# Altium footprint library Reflow3D1411sep.PcbLib: 657 footprints (part 22 of 42)
Each footprint in its own frame and in the unit in brackets; x right, y up, seen from the top. Pads: shape width x height; smd on the part's side, far side on the other; paste and mask are expansions set on the pad; w line width, h text height; cw(c..) or ccw(c..) is an arc to the next point about the centre after c.
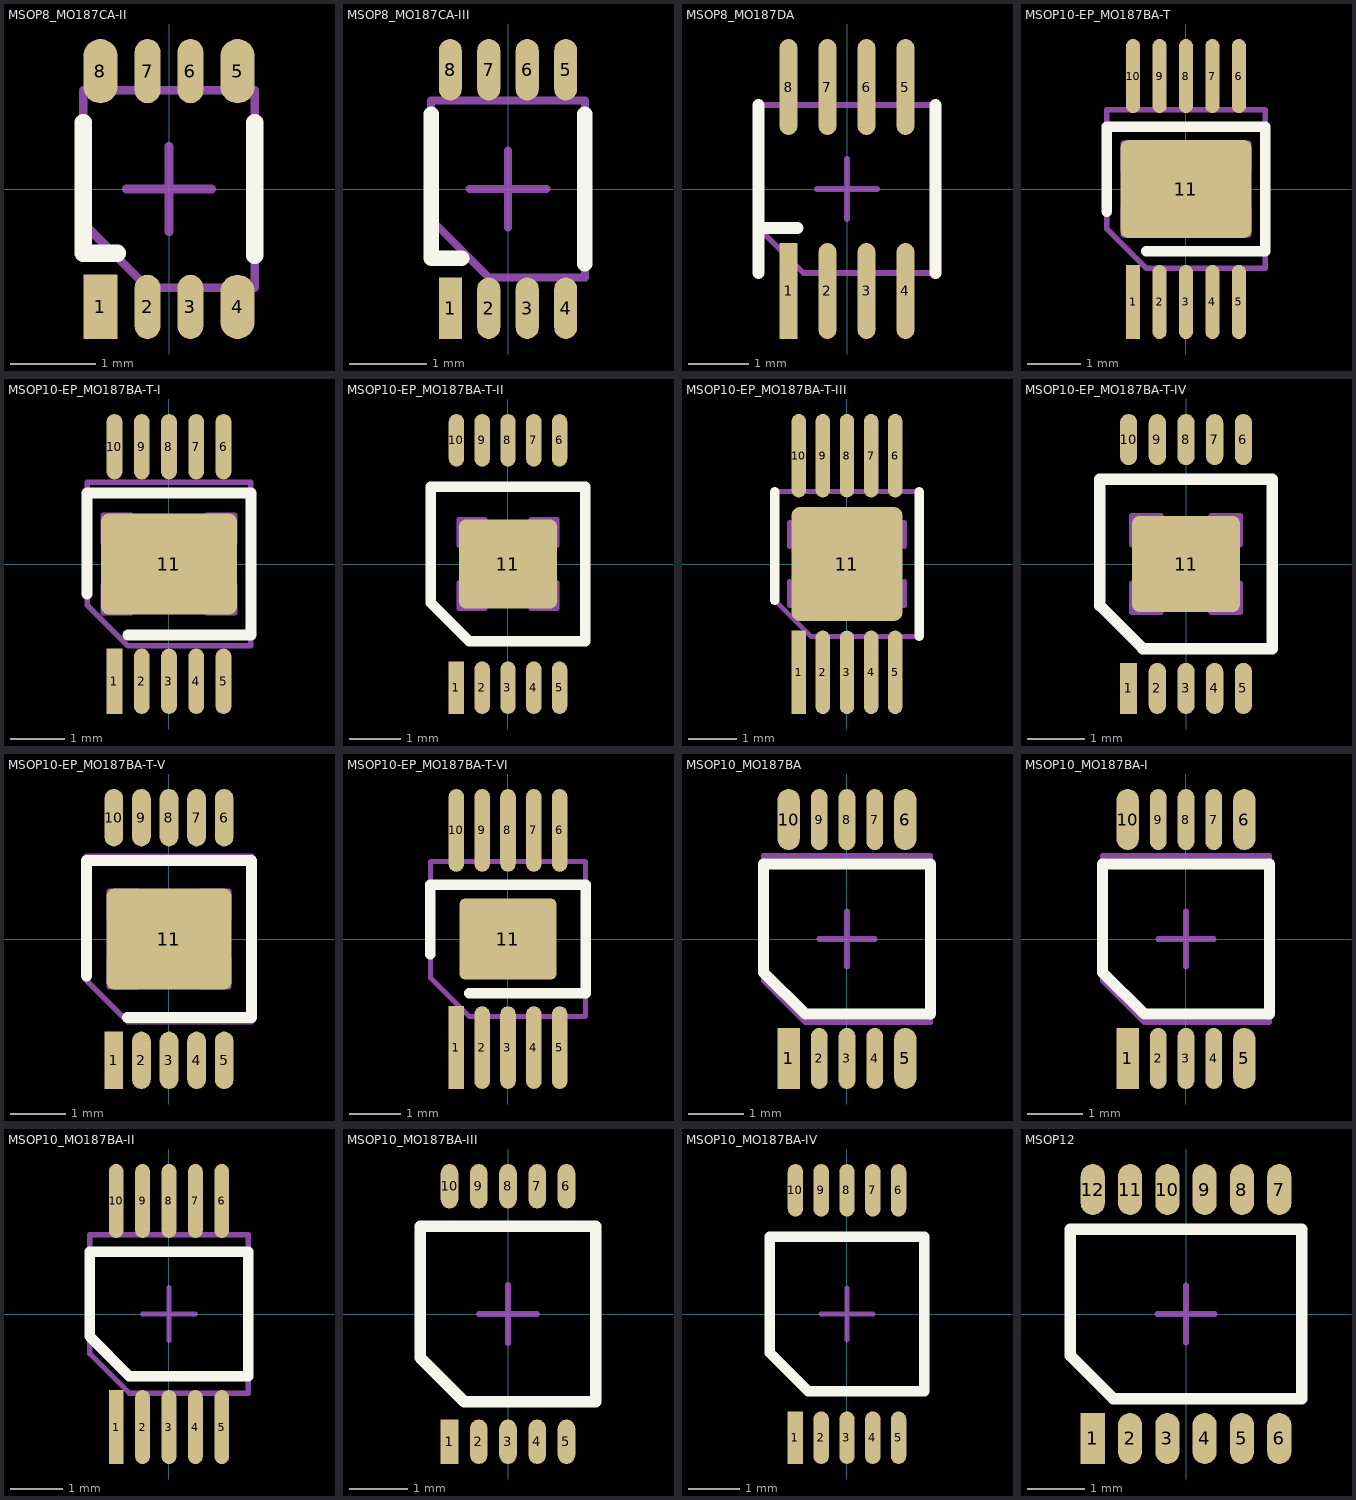
[diagram p21: the footprints below, top view; thin cyan lines are the x and y axes]

## MSOP8_MO187CA-II [mm] "www.nxp.com, sot765-1_po.pdf, sot765-1_fr.pdf; www.jedec.org, mo-187e.pdf"
height 0.8
pads (8):
  rect 0.4x0.75 smd mask+0.05: 1(-0.8,-1.375)
  oval 0.3x0.75 smd mask+0.05: 2(-0.25,-1.375) 3(0.25,-1.375) 6(0.25,1.375) 7(-0.25,1.375)
  oval 0.4x0.75 smd mask+0.05: 4(0.8,-1.375) 5(0.8,1.375) 8(-0.8,1.375)
Top Overlay:
  lines w0.2: -1,0.775 -1,-0.75 -0.6,-0.75 ; 1,-0.775 1,0.775
Mechanical 13:
  lines w0.1: -1,-0.4 -1,1.15 1,1.15 1,-1.15 -0.25,-1.15 -1,-0.4
Mechanical 15:
  lines w0.1: -0.5,0 0.5,0 ; 0,-0.5 0,0.5
3D body: height 1, standoff 0, extent -1.05,-1.2 1.05,1.2

## MSOP8_MO187CA-III [mm] "www.ti.com, sces477c.pdf"
height 0.75
pads (8):
  rect 0.3x0.8 smd mask+0.05: 1(-0.75,-1.55)
  oval 0.3x0.8 smd mask+0.05: 2(-0.25,-1.55) 3(0.25,-1.55) 4(0.75,-1.55) 5(0.75,1.55) 6(0.25,1.55) 7(-0.25,1.55) 8(-0.75,1.55)
Top Overlay:
  lines w0.2: -1,0.975 -1,-0.9 -0.6,-0.9 ; 1,-0.975 1,0.975
Mechanical 13:
  lines w0.1: -1,-0.4 -1,1.15 1,1.15 1,-1.15 -0.25,-1.15 -1,-0.4
Mechanical 15:
  lines w0.1: -0.5,0 0.5,0 ; 0,-0.5 0,0.5
3D body: height 0.9, standoff 0, extent -1.05,-1.2 1.05,1.2

## MSOP8_MO187DA [mm] "www.ti.com, mpds049b.pdf, DCT8.asc"
height 1.18
pads (8):
  rect 0.3x1.6 smd mask+0.075: 1(-0.975,-1.7)
  oval 0.3x1.6 smd mask+0.075: 2(-0.325,-1.7) 3(0.325,-1.7) 4(0.975,-1.7) 5(0.975,1.7) 6(0.325,1.7) 7(-0.325,1.7) 8(-0.975,1.7)
Top Overlay:
  lines w0.2: -1.475,-1.4 -1.475,1.4 ; -1.475,-0.65 -0.825,-0.65 ; 1.475,-1.4 1.475,1.4
Mechanical 13:
  lines w0.1: -1.475,-0.65 -0.725,-1.4 1.475,-1.4 1.475,1.4 -1.475,1.4 -1.475,-0.65
Mechanical 15:
  lines w0.1: -0.5,0 0.5,0 ; 0,-0.5 0,0.5
3D body: height 1.3, standoff 0, extent -1.575,-1.45 1.575,1.45

## MSOP10-EP_MO187BA-T [mm] "www.maxim-ic.com, 21-0109.PDF, 90-0148.PDF"
height 0.93
pads (11):
  rect 0.27x1.4 smd mask+0.05: 1(-1,-2.135)
  oval 0.27x1.4 smd mask+0.05: 2(-0.5,-2.135) 3(0,-2.135) 4(0.5,-2.135) 5(1,-2.135) 6(1,2.135) 7(0.5,2.135) 8(0,2.135) 9(-0.5,2.135) 10(-1,2.135)
  rrect15% 2.47x1.85 smd mask+0.075: 11(0,0)
Top Overlay:
  lines w0.2: -1.5,-0.425 -1.5,1.175 1.5,1.175 1.5,-1.175 -0.75,-1.175
Mechanical 13:
  lines w0.1: -1.185,-0.365 -1.185,-0.865 -0.685,-0.865 ; -1.185,0.365 -1.185,0.865 -0.685,0.865 ; 0.685,-0.865 1.185,-0.865 1.185,-0.365 ; 0.685,0.865 1.185,0.865 1.185,0.365 ; -1.5,-0.75 -0.75,-1.5 1.5,-1.5 1.5,1.5 -1.5,1.5 -1.5,-0.75
Mechanical 15:
  lines w0.1: -0.5,0 0.5,0 ; 0,-0.5 0,0.5
3D body: height 1.1, standoff 0, extent -1.525,-1.525 1.525,1.525

## MSOP10-EP_MO187BA-T-I [mm] "www.hittite.com, ms10_ms10g_package_info.pdf; www.jedec.org, mo-187e.pdf"
height 0.93
pads (11):
  rect 0.29x1.2 smd mask+0.05: 1(-1,-2.15)
  oval 0.29x1.2 smd mask+0.05: 2(-0.5,-2.15) 3(0,-2.15) 4(0.5,-2.15) 5(1,-2.15) 6(1,2.15) 7(0.5,2.15) 8(0,2.15) 9(-0.5,2.15) 10(-1,2.15)
  rrect15% 2.49x1.85 smd mask+0.075: 11(0,0)
Top Overlay:
  lines w0.2: -1.5,-0.55 -1.5,1.3 1.5,1.3 1.5,-1.3 -0.75,-1.3
Mechanical 13:
  lines w0.1: -1.205,-0.39 -1.205,-0.89 -0.705,-0.89 ; -1.205,0.39 -1.205,0.89 -0.705,0.89 ; 0.705,-0.89 1.205,-0.89 1.205,-0.39 ; 0.705,0.89 1.205,0.89 1.205,0.39 ; -1.5,-0.75 -1.5,1.5 1.5,1.5 1.5,-1.5 -0.75,-1.5 -1.5,-0.75
Mechanical 15:
  lines w0.1: -0.5,0 0.5,0 ; 0,-0.5 0,0.5
3D body: height 1.1, standoff 0, extent -1.55,-1.55 1.55,1.55

## MSOP10-EP_MO187BA-T-II [mm] "www.national.com, muc10a.pdf"
height 0.97
pads (11):
  rect 0.3x1.02 smd mask+0.05: 1(-1,-2.4)
  oval 0.3x1.02 smd mask+0.05: 2(-0.5,-2.4) 3(0,-2.4) 4(0.5,-2.4) 5(1,-2.4) 6(1,2.4) 7(0.5,2.4) 8(0,2.4) 9(-0.5,2.4) 10(-1,2.4)
  rrect15% 1.9x1.73 smd mask+0.075: 11(0,0)
Top Overlay:
  lines w0.2: -1.5,-0.75 -0.75,-1.5 1.5,-1.5 1.5,1.5 -1.5,1.5 -1.5,-0.75
Mechanical 13:
  lines w0.1: -0.95,-0.365 -0.95,-0.865 -0.45,-0.865 ; -0.95,0.365 -0.95,0.865 -0.45,0.865 ; 0.45,-0.865 0.95,-0.865 0.95,-0.365 ; 0.45,0.865 0.95,0.865 0.95,0.365 ; -1.5,-0.75 -0.75,-1.5 1.5,-1.5 1.5,1.5 -1.5,1.5 -1.5,-0.75
Mechanical 15:
  lines w0.1: -0.5,0 0.5,0 ; 0,-0.5 0,0.5
3D body: height 1.09, standoff 0, extent -1.55,-1.55 1.55,1.55

## MSOP10-EP_MO187BA-T-III [mm] "www.national.com, mxf10a.pdf"
height 0.95
pads (11):
  rect 0.3x1.73 smd mask+0.05: 1(-1,-2.245)
  oval 0.3x1.73 smd mask+0.05: 2(-0.5,-2.245) 3(0,-2.245) 4(0.5,-2.245) 5(1,-2.245) 6(1,2.245) 7(0.5,2.245) 8(0,2.245) 9(-0.5,2.245) 10(-1,2.245)
  rrect15% 2.3x2.36 smd mask+0.05: 11(0,0)
Top Overlay:
  lines w0.2: -1.5,-0.75 -1.5,1.5 ; 1.5,-1.5 1.5,1.5
Mechanical 13:
  lines w0.1: -1.195,-0.365 -1.195,-0.865 -0.695,-0.865 ; -1.195,0.365 -1.195,0.865 -0.695,0.865 ; 0.695,-0.865 1.195,-0.865 1.195,-0.365 ; 0.695,0.865 1.195,0.865 1.195,0.365 ; -1.5,-0.75 -0.75,-1.5 1.5,-1.5 1.5,1.5 -1.5,1.5 -1.5,-0.75
Mechanical 15:
  lines w0.1: -0.5,0 0.5,0 ; 0,-0.5 0,0.5
3D body: height 1.1, standoff 0, extent -1.55,-1.55 1.55,1.55

## MSOP10-EP_MO187BA-T-IV [mm] "www.linear.com, MSOP_10_05-08-1664.pdf"
height 0.96
pads (11):
  rect 0.3x0.89 smd mask+0.05: 1(-1,-2.17)
  oval 0.3x0.89 smd mask+0.05: 2(-0.5,-2.17) 3(0,-2.17) 4(0.5,-2.17) 5(1,-2.17) 6(1,2.17) 7(0.5,2.17) 8(0,2.17) 9(-0.5,2.17) 10(-1,2.17)
  rrect15% 1.88x1.68 smd mask+0.075: 11(0,0)
Top Overlay:
  lines w0.2: -1.5,-0.725 -1.5,1.475 1.5,1.475 1.5,-1.475 -0.75,-1.475 -1.5,-0.725
Mechanical 13:
  lines w0.1: -0.94,-0.34 -0.94,-0.84 -0.44,-0.84 ; -0.94,0.34 -0.94,0.84 -0.44,0.84 ; 0.44,-0.84 0.94,-0.84 0.94,-0.34 ; 0.44,0.84 0.94,0.84 0.94,0.34 ; -1.5,-0.75 -0.75,-1.5 1.5,-1.5 1.5,1.5 -1.5,1.5 -1.5,-0.75
Mechanical 15:
  lines w0.1: -0.5,0 0.5,0 ; 0,-0.5 0,0.5
3D body: height 1.1, standoff 0, extent -1.55,-1.55 1.55,1.55

## MSOP10-EP_MO187BA-T-V [mm] "www.analog.com, RH_10_1.pdf, RH-10-1.pdf"
height 0.96
pads (11):
  rect 0.34x1.04 smd mask+0.085: 1(-1,-2.2)
  oval 0.34x1.04 smd mask+0.085: 2(-0.5,-2.2) 3(0,-2.2) 4(0.5,-2.2) 5(1,-2.2) 6(1,2.2) 7(0.5,2.2) 8(0,2.2) 9(-0.5,2.2) 10(-1,2.2)
  rrect15% 2.27x1.83 smd mask+0.075: 11(0,0)
Top Overlay:
  lines w0.2: -1.5,-0.675 -1.5,1.425 1.5,1.425 1.5,-1.425 -0.75,-1.425
Mechanical 13:
  lines w0.1: -1.085,-0.365 -1.085,-0.865 -0.585,-0.865 ; -1.085,0.365 -1.085,0.865 -0.585,0.865 ; 0.585,-0.865 1.085,-0.865 1.085,-0.365 ; 0.585,0.865 1.085,0.865 1.085,0.365 ; -1.5,-0.75 -1.5,1.5 1.5,1.5 1.5,-1.5 -0.75,-1.5 -1.5,-0.75
Mechanical 15:
  lines w0.1: -0.5,0 0.5,0 ; 0,-0.5 0,0.5
3D body: height 1.1, standoff 0, extent -1.55,-1.55 1.55,1.55

## MSOP10-EP_MO187BA-T-VI [mm] "www.ti.com, tlv2474.pdf"
height 0.95
pads (11):
  rect 0.3x1.6 smd mask+0.05: 1(-1,-2.1)
  oval 0.3x1.6 smd mask+0.05: 2(-0.5,-2.1) 3(0,-2.1) 4(0.5,-2.1) 5(1,-2.1) 6(1,2.1) 7(0.5,2.1) 8(0,2.1) 9(-0.5,2.1) 10(-1,2.1)
  rrect15% 1.88x1.57 smd mask+0.075: 11(0,0)
Top Overlay:
  lines w0.2: -1.5,-0.3 -1.5,1.05 1.5,1.05 1.5,-1.05 -0.75,-1.05
Mechanical 13:
  lines w0.1: -0.84,-0.225 -0.84,-0.725 -0.34,-0.725 ; -0.84,0.225 -0.84,0.725 -0.34,0.725 ; 0.34,-0.725 0.84,-0.725 0.84,-0.225 ; 0.34,0.725 0.84,0.725 0.84,0.225 ; -1.5,-0.75 -1.5,1.5 1.5,1.5 1.5,-1.5 -0.75,-1.5 -1.5,-0.75
Mechanical 15:
  lines w0.1: -0.5,0 0.5,0 ; 0,-0.5 0,0.5
3D body: height 1.1, standoff 0, extent -1.55,-1.55 1.55,1.55

## MSOP10_MO187BA [mm] "www.nxp.com, sot552-1_po.pdf, sot552-1_fr.pdf"
height 0.98
pads (10):
  rect 0.4x1.1 smd mask+0.05: 1(-1.05,-2.15)
  oval 0.3x1.1 smd mask+0.05: 2(-0.5,-2.15) 3(0,-2.15) 4(0.5,-2.15) 7(0.5,2.15) 8(0,2.15) 9(-0.5,2.15)
  oval 0.4x1.1 smd mask+0.05: 5(1.05,-2.15) 6(1.05,2.15) 10(-1.05,2.15)
Top Overlay:
  lines w0.2: -1.5,-0.6 -1.5,1.35 1.5,1.35 1.5,-1.35 -0.75,-1.35 -1.5,-0.6
Mechanical 13:
  lines w0.1: -1.5,-0.75 -1.5,1.5 1.5,1.5 1.5,-1.5 -0.75,-1.5 -1.5,-0.75
Mechanical 15:
  lines w0.1: -0.5,0 0.5,0 ; 0,-0.5 0,0.5
3D body: height 1.1, standoff 0, extent -1.55,-1.55 1.55,1.55

## MSOP10_MO187BA-I [mm] "www.nxp.com, sot552-1_fr.pdf; www.analog.com, RM_10.pdf; www.jedec.org, mo-187e.pdf"
height 0.93
pads (10):
  rect 0.4x1.1 smd mask+0.05: 1(-1.05,-2.15)
  oval 0.3x1.1 smd mask+0.05: 2(-0.5,-2.15) 3(0,-2.15) 4(0.5,-2.15) 7(0.5,2.15) 8(0,2.15) 9(-0.5,2.15)
  oval 0.4x1.1 smd mask+0.05: 5(1.05,-2.15) 6(1.05,2.15) 10(-1.05,2.15)
Top Overlay:
  lines w0.2: -1.5,-0.6 -0.75,-1.35 1.5,-1.35 1.5,1.35 -1.5,1.35 -1.5,-0.6
Mechanical 13:
  lines w0.1: -1.5,-0.75 -0.75,-1.5 1.5,-1.5 1.5,1.5 -1.5,1.5 -1.5,-0.75
Mechanical 15:
  lines w0.1: -0.5,0 0.5,0 ; 0,-0.5 0,0.5
3D body: height 1.1, standoff 0, extent -1.55,-1.55 1.55,1.55

## MSOP10_MO187BA-II [mm] "www.maxim-ic.com, 21-0061.PDF, 90-0330.PDF"
height 0.95
pads (10):
  rect 0.28x1.4 smd mask+0.05: 1(-1,-2.14)
  oval 0.28x1.4 smd mask+0.05: 2(-0.5,-2.14) 3(0,-2.14) 4(0.5,-2.14) 5(1,-2.14) 6(1,2.14) 7(0.5,2.14) 8(0,2.14) 9(-0.5,2.14) 10(-1,2.14)
Top Overlay:
  lines w0.2: -1.5,-0.425 -1.5,1.175 1.5,1.175 1.5,-1.175 -0.75,-1.175 -1.5,-0.425
Mechanical 13:
  lines w0.1: -1.5,-0.75 -1.5,1.5 1.5,1.5 1.5,-1.5 -0.75,-1.5 -1.5,-0.75
Mechanical 15:
  lines w0.1: -0.5,0 0.5,0 ; 0,-0.5 0,0.5
3D body: height 1.1, standoff 0, extent -1.525,-1.525 1.525,1.525

## MSOP10_MO187BA-III [mm] "www.aosmd.com, AOZ8006FI.pdf"
height 1.02
pads (10):
  rect 0.3x0.76 smd mask+0.05: 1(-1,-2.185)
  oval 0.3x0.76 smd mask+0.05: 2(-0.5,-2.185) 3(0,-2.185) 4(0.5,-2.185) 5(1,-2.185) 6(1,2.185) 7(0.5,2.185) 8(0,2.185) 9(-0.5,2.185) 10(-1,2.185)
Top Overlay:
  lines w0.2: -1.5,-0.75 -1.5,1.5 1.5,1.5 1.5,-1.5 -0.75,-1.5 -1.5,-0.75
Mechanical 13:
  lines w0.1: -1.5,-0.75 -1.5,1.5 1.5,1.5 1.5,-1.5 -0.75,-1.5 -1.5,-0.75
Mechanical 15:
  lines w0.1: -0.5,0 0.5,0 ; 0,-0.5 0,0.5
3D body: height 1.12, standoff 0, extent -1.55,-1.55 1.55,1.55

## MSOP10_MO187BA-IV [mm] "www.national.com, mub10a.pdf"
height 0.97
pads (10):
  rect 0.3x1.02 smd mask+0.05: 1(-1,-2.4)
  oval 0.3x1.02 smd mask+0.05: 2(-0.5,-2.4) 3(0,-2.4) 4(0.5,-2.4) 5(1,-2.4) 6(1,2.4) 7(0.5,2.4) 8(0,2.4) 9(-0.5,2.4) 10(-1,2.4)
Top Overlay:
  lines w0.2: -1.5,-0.75 -1.5,1.5 1.5,1.5 1.5,-1.5 -0.75,-1.5 -1.5,-0.75
Mechanical 13:
  lines w0.1: -1.5,-0.75 -1.5,1.5 1.5,1.5 1.5,-1.5 -0.75,-1.5 -1.5,-0.75
Mechanical 15:
  lines w0.1: -0.5,0 0.5,0 ; 0,-0.5 0,0.5
3D body: height 1.09, standoff 0, extent -1.55,-1.55 1.55,1.55

## MSOP12 [mm] "www.linear.com, MSOP_12_ 05-08-1668.pdf"
height 0.96
pads (12):
  rect 0.42x0.89 smd mask+0.05: 1(-1.625,-2.17)
  oval 0.42x0.89 smd mask+0.05: 2(-0.975,-2.17) 3(-0.325,-2.17) 4(0.325,-2.17) 5(0.975,-2.17) 6(1.625,-2.17) 7(1.625,2.17) 8(0.975,2.17) 9(0.325,2.17) 10(-0.325,2.17) 11(-0.975,2.17) 12(-1.625,2.17)
Top Overlay:
  lines w0.2: -2.02,-0.725 -1.27,-1.475 2.02,-1.475 2.02,1.475 -2.02,1.475 -2.02,-0.725
Mechanical 13:
  lines w0.1: -2.02,-0.75 -1.27,-1.5 2.02,-1.5 2.02,1.5 -2.02,1.5 -2.02,-0.75
Mechanical 15:
  lines w0.1: -0.5,0 0.5,0 ; 0,-0.5 0,0.5
3D body: height 1.1, standoff 0, extent -2.07,-1.55 2.07,1.55